# Altium schematic symbol library BARKO_SCHLIB.SchLib: 1064 symbols (part 9 of 11)
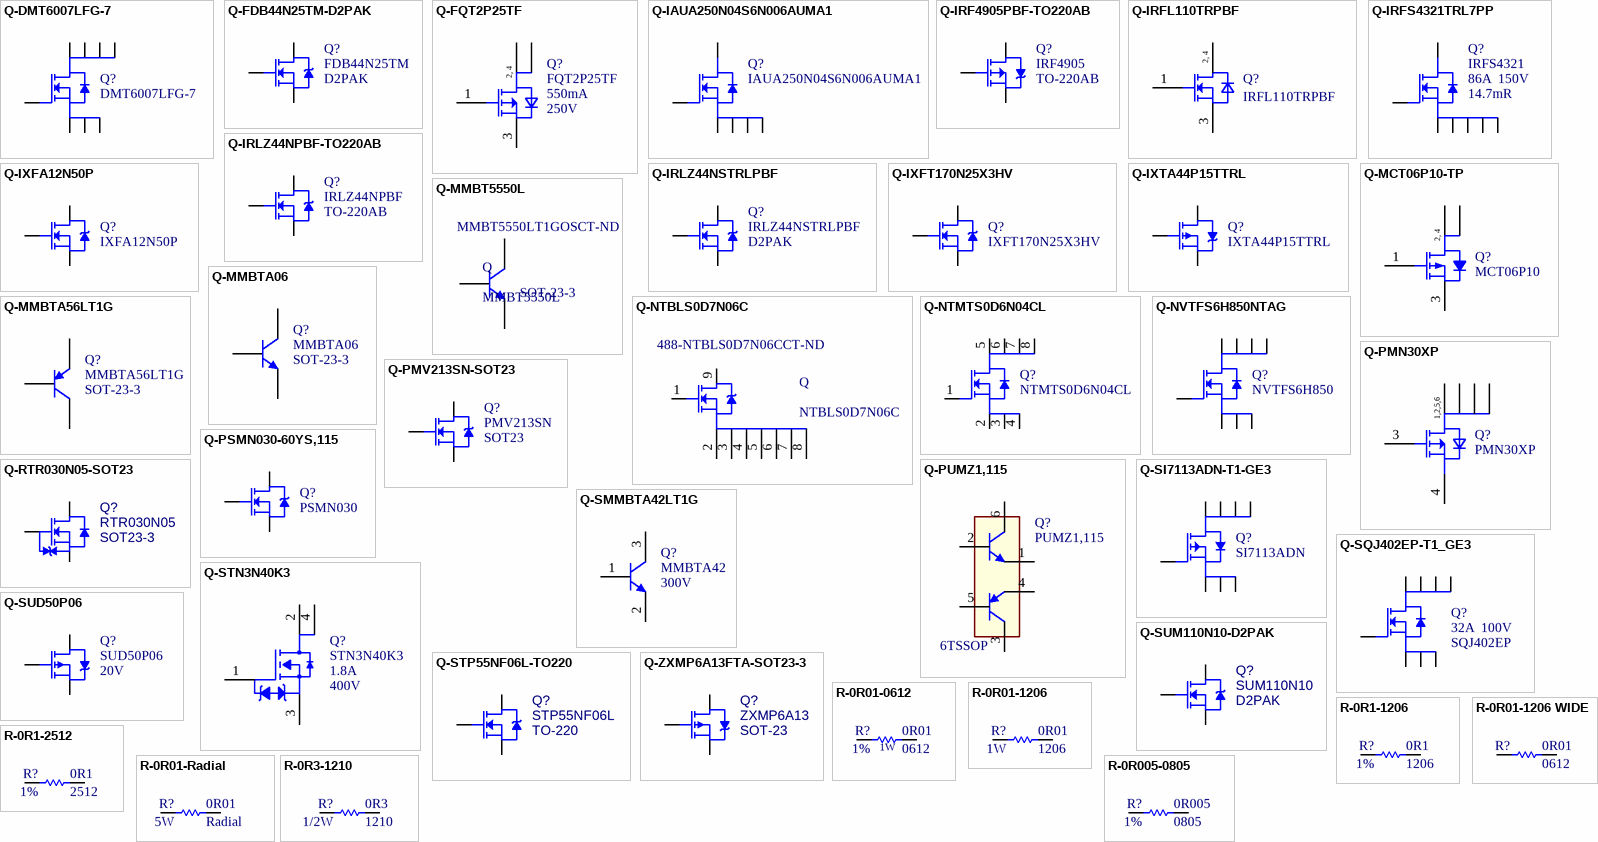
[diagram p49: symbols Q-DMT6007LFG-7 to R-0R005-0805]

## Q-SUM110N10-D2PAK
designator Q?, comment SUM110N10  Case/Package: D2PAK
MOSFET N-CH 100V 110A D2PAK; Manufacturer: Vishay Siliconix; Manufacturer Part Number: SUM110N10-09-E3; Nominal Vgs: 4V; Rds On Max: 9.5mR; Input Capacitance: 6.7nF; Rise Time: 125ns; Max Power Dissipation: 3.75W; Gate to Source Voltage (Vgs): 20V; Fall Time: 130ns; Turn-Off Delay Time: 55ns; Turn-On Delay Time: 20ns; Number of Elements: 1; Reverse Recovery Time: 70ns; Element Configuration: Single; .PCBCHK: USED; .Creator: F:TALI; Washability: OK; Supplier 1: Digi-Key; Supplier Part Number 1: SUM110N10-09-E3DKR-ND; Stock 1: 11942; Pricing 1: 1=3.67, 10=3.279, 100=2.6892 (USD); Mount: Surface Mount; Number of Pins: 3; Weight: 0.050717oz; Min Operating Temperature: -55°C; Max Operating Temperature: 175°C; Package Quantity: 800; Packaging: Tape and Reel; Dual Supply Voltage: 100V; Drain to Source Voltage (Vdss): 100V; Continuous Drain Current (ID): 110A; Drain to Source Breakdown Voltage: 100V; Drain to Source Resistance: 9.5mR; Threshold Voltage: 4V; Power Dissipation: 3.75W; Termination: SMD/SMT; Number of Channels: 1; On-State Resistance: 9.5MR; Length: 10.41mm; Height: 4.83mm; Width: 9.65mm; Radiation Hardening: No; REACH SVHC: Unknown; Lead Free: Lead Free; ComponentLink1URL: http://www.vishay.com/docs/70677/sum110n1.pdf; ComponentLink1Description: http://www.vishay.com/docs/70677/sum110n1.pdf; ComponentLink2URL: http://www.farnell.com/datasheets/492045.pdf; ComponentLink2Description: http://www.farnell.com/datasheets/492045.pdf; .SCHCHK: USED
footprint D2PAK-TO-263
pins: 1 G, 2 S, 3 D

## Q-ZXMP6A13FTA-SOT23-3
designator Q?, comment ZXMP6A13  Case/Package: SOT-23
MOSFET P-CH 60V 0.9A SOT23-3; Manufacturer: Diodes Zetex; Manufacturer Part Number: ZXMP6A13FTA; Input Capacitance: 219pF; Number of Elements: 1; Max Power Dissipation: 625mW; Rise Time: 2.2ns; Rds On Max: 400mR; Drain to Source Resistance: 600mR; Gate to Source Voltage (Vgs): 20V; Fall Time: 5.7ns; Turn-Off Delay Time: 11.2ns; Turn-On Delay Time: 1.6ns; Drain to Source Voltage (Vdss): -60V; Continuous Drain Current (ID): 1.1A; Threshold Voltage: -3V; Power Dissipation: 806mW; Element Configuration: Single; Current Rating: -1.1A; .PCBCHK: USED; .Creator: F:TALI; Washability: OK; Supplier 1: Digi-Key; Supplier Part Number 1: ZXMP6A13FDKR-ND; Stock 1: 261434; Pricing 1: 1=0.65, 10=0.544, 100=0.4079, 500=0.29912, 1000=0.23113 (USD); Mount: Surface Mount; Number of Pins: 3; Weight: 0.000282oz; Contact Plating: Matte,Tin; Min Operating Temperature: -55°C; Max Operating Temperature: 150°C; Packaging: Tape and Reel; Package Quantity: 3000; Number of Channels: 1; On-State Resistance: 600mR; Voltage Rating (DC): -60V; Length: 3.04mm; Height: 1.02mm; Width: 1.4mm; Radiation Hardening: No; REACH SVHC: No SVHC; Lead Free: Lead Free; ComponentLink1URL: http://www.farnell.com/datasheets/1915640.pdf; ComponentLink1Description: http://www.farnell.com/datasheets/1915640.pdf; ComponentLink2URL: http://docs-europe.electrocomponents.com/webdocs/0d2e/0900766b80d2efb2.pdf; ComponentLink2Description: http://docs-europe.electrocomponents.com/webdocs/0d2e/0900766b80d2efb2.pdf; ComponentLink3URL: http://www.diodes.com/datasheets/ZXMP6A13F.pdf; ComponentLink3Description: http://www.diodes.com/datasheets/ZXMP6A13F.pdf; ComponentLink4URL: http://www.mouser.com/ds/2/115/ZXMP6A13F-77652.pdf; ComponentLink4Description: http://www.mouser.com/ds/2/115/ZXMP6A13F-77652.pdf; .SCHCHK: USED; Supplier 2: Digi-Key; Supplier Part Number 2: SUD50P06-15-GE3DKR-ND; Stock 2: 17302; Pricing 2: 1=2.57, 10=2.319, 100=1.8637, 500=1.44958, 1000=1.20108 (USD); Drain to Source Breakdown Voltage: -60V; ComponentLink5URL: http://www.vishay.com/docs/68940/sud50p06.pdf?src-supplier=Digi-Key; ComponentLink5Description: http://www.vishay.com/docs/68940/sud50p06.pdf?src-supplier=Digi-Key; ComponentLink6URL: http://www.farnell.com/datasheets/2049645.pdf?src-supplier=Element14; ComponentLink6Description: http://www.farnell.com/datasheets/2049645.pdf?src-supplier=Element14; ComponentLink7URL: http://www.mouser.com/ds/2/427/sud50p06-244530.pdf?src-supplier=Mouser; ComponentLink7Description: http://www.mouser.com/ds/2/427/sud50p06-244530.pdf?src-supplier=Mouser; ComponentLink8URL: http://www.vishay.com/docs/68940/sud50p06.pdf?src-supplier=Farnell; ComponentLink8Description: http://www.vishay.com/docs/68940/sud50p06.pdf?src-supplier=Farnell; ComponentLink9URL: http://www.vishay.com/docs/68940/sud50p06.pdf?src-supplier=Avnet; ComponentLink9Description: http://www.vishay.com/docs/68940/sud50p06.pdf?src-supplier=Avnet; ComponentLink10URL: http://www.vishay.com/docs/68940/sud50p06.pdf?src-supplier=Avnet+Europe; ComponentLink10Description: http://www.vishay.com/docs/68940/sud50p06.pdf?src-supplier=Avnet+Europe; ComponentLink11URL: http://www.vishay.com/docs/68940/sud50p06.pdf?src-supplier=Future+Electronics; ComponentLink11Description: http://www.vishay.com/docs/68940/sud50p06.pdf?src-supplier=Future+Electronics; ComponentLink12URL: http://datasheet.iiic.cc/vishay_[siliconix]/SUD50P06-15-GE3.pdf?src-supplier=IIIC; ComponentLink12Description: http://datasheet.iiic.cc/vishay_[siliconix]/SUD50P06-15-GE3.pdf?src-supplier=IIIC; RoHS: No
footprint SOT23-3
pins: 1 G, 2 S, 3 D

## R-0R01-0612
designator R?, comment 0R01  Tolerance: 1%  Power Rating: 1W  Case Code (Imperial): 0612
RES 0.01 OHM 1W 1206 WIDE; Manufacturer: Panasonic; Manufacturer Part Number: ERJ-B2CFR01V; Resistance: 10mR; Temperature Coefficient: 300ppm/°C; Voltage Rating: 200V; Washability: OK; .Creator: M.OZKAN; .PCBCHK: USED; Supplier 1: Digi-Key; Stock 1: 0; Pricing 1: 5000=0.08296 (USD); RoHS: Yes; Mount: Surface Mount; Case/Package: 1206; Contact Plating: Tin; Case Code (Metric): 1632; Min Operating Temperature: -55°C; Max Operating Temperature: 155°C; Composition: Thick Film; Packaging: Tape and Reel; Package Quantity: 5000; Number of Terminations: 2; Termination: SMD/SMT; Military Standard: Not; Max Power Dissipation: 1W; Voltage Rating (DC): 200V; Length: 1.6mm; Height: 0.031inch; Width: 0.126inch; Depth: 3.2mm; Radiation Hardening: No; REACH SVHC: Unknown; Lead Free: Lead Free; ComponentLink1URL: https://datasheet.ciiva.com/17212/aoa0000ce23-17212038.pdf?src-supplier=Avnet+Europe; ComponentLink1Description: https://datasheet.ciiva.com/17212/aoa0000ce23-17212038.pdf?src-supplier=Avnet+Europe; ComponentLink2URL: https://datasheet.ciiva.com/46437/1497268-46437047.pdf?src-supplier=Element14; ComponentLink2Description: https://datasheet.ciiva.com/46437/1497268-46437047.pdf?src-supplier=Element14; ComponentLink3URL: https://datasheet.ciiva.com/24065/aoa0000ce23-72160-24065449.pdf?src-supplier=Mouser; ComponentLink3Description: https://datasheet.ciiva.com/24065/aoa0000ce23-72160-24065449.pdf?src-supplier=Mouser; ComponentLink4URL: https://datasheet.ciiva.com/9194/aoa0000ce23-9194127.pdf?src-supplier=Avnet; ComponentLink4Description: https://datasheet.ciiva.com/9194/aoa0000ce23-9194127.pdf?src-supplier=Avnet; Supplier Part Number 1: ERJ-B2CFR01V-ND; .SCHCHK: USED
footprint R-0612 (Chip Resistor, 2-Leads, Body 1,60x3,20mm, IPC Medium Density)
pins: 1, 2

## R-0R01-1206
designator R?, comment 0R01  Power Rating: 1W  Case/Package: 1206
RES 0.01 OHM 1% 1W 1206; Manufacturer: Panasonic; Manufacturer Part Number: ERJ8CWFR010V; Resistance: 10mR; Temperature Coefficient: 75ppm/°C; Washability: OK; .Creator: M.OZKAN; .PCBCHK: USED; Supplier 1: Digi-Key; Stock 1: 255816; Pricing 1: 1=0.71000, 10=0.54500, 100=0.22910, 1000=0.12638, 2500=0.11848 (USD); RoHS: Yes; Mount: Surface Mount; Case Code (Metric): 3216; Case Code (Imperial): 1206; Min Operating Temperature: -55°C; Max Operating Temperature: 125°C; Packaging: Cut Tape; Tolerance: 1%; Composition: Thick Film; Number of Terminations: 2; Military Standard: Not; Termination: Flat; Max Power Dissipation: 1W; Features: Automotive AEC-Q200; Length: 3.2mm; Height: 0.03inch; Width: 0.063inch; Depth: 1.6mm; REACH SVHC: No SVHC; Lead Free: Lead Free; ComponentLink1URL: https://datasheet.ciiva.com/25608/0900766b81107548-25608655.pdf?src-supplier=RSComponents; ComponentLink1Description: https://datasheet.ciiva.com/25608/0900766b81107548-25608655.pdf?src-supplier=RSComponents; ComponentLink2URL: https://datasheet.ciiva.com/48532/erj8cw-eng-tds-48532780.pdf?src-supplier=Distrelec; ComponentLink2Description: https://datasheet.ciiva.com/48532/erj8cw-eng-tds-48532780.pdf?src-supplier=Distrelec; ComponentLink3URL: https://datasheet.ciiva.com/7937/1790602-7937371.pdf?src-supplier=Element14; ComponentLink3Description: https://datasheet.ciiva.com/7937/1790602-7937371.pdf?src-supplier=Element14; Supplier Part Number 1: P0.01BVCT-ND; .SCHCHK: USED
footprint R-1206
pins: 1, 2

## R-0R1-1206
designator R?, comment 0R1  Tolerance: 1%  Case/Package: 1206
RES 0.1 OHM 1% 1/2W 1206; Manufacturer: Stackpole Electronics; Manufacturer Part Number: CSR1206FTR100; Resistance: 100mR; Max Power Dissipation: 500mW; Temperature Coefficient: 100ppm/°C; Washability: OK; .Creator: M.OZKAN; .PCBCHK: USED; Supplier 1: Digi-Key; Stock 1: 200668; Pricing 1: 1=0.42000, 10=0.31900, 25=0.24240, 50=0.18020, 100=0.13400, 250=0.11320, 500=0.09702, 1000=0.07392 (USD); RoHS: Yes; Mount: Surface Mount; Case Code (Metric): 3216; Case Code (Imperial): 1206; Contact Plating: Tin,Matte; Min Operating Temperature: -55°C; Max Operating Temperature: 155°C; Packaging: Tape and Reel; Package Quantity: 1; Composition: Thick Film; Number of Terminations: 2; Military Standard: Not; Length: 0.12inch; Height: 0.026inch; Width: 0.061inch; Depth: 1.55mm; Radiation Hardening: No; Lead Free: Lead Free; ComponentLink1URL: https://datasheet.ciiva.com/26835/getdatasheetpartid-743581-26835493.pdf?src-supplier=Verical; ComponentLink1Description: https://datasheet.ciiva.com/26835/getdatasheetpartid-743581-26835493.pdf?src-supplier=Verical; Supplier Part Number 1: CSR1206FTR100CT-ND; .SCHCHK: USED
footprint R-1206
pins: 1, 2

## R-0R01-1206 WIDE
designator R?, comment 0R01  Case/Package: 0612
RES SMD 0.01 OHM 1.5W 1206 WIDE; Manufacturer: Stackpole Electronics; Manufacturer Part Number: CSRF0612FT10L0; Resistance: 10mR; Tolerance: 1%; Temperature Coefficient: 75ppm/°C; .PCBCHK: USED; .Creator: F:TALI; Power Rating: 100mW; Voltage Rating: 50V; Washability: OK; Supplier 1: Digi-Key; Supplier Part Number 1: CSRF0612FT10L0DKR-ND; Stock 1: 11641; Pricing 1: 1=0.63, 10=0.526, 25=0.4504, 50=0.4054, 100=0.3529, 250=0.31532, 500=0.25526, 1000=0.20646 (USD); Case Code (Metric): 3216; Min Operating Temperature: -55°C; Max Operating Temperature: 170°C; Packaging: Tape and Reel; Composition: Metal Foil; Number of Terminations: 2; Max Power Dissipation: 1.5W; Features: Moisture Resistant; Length: 0.063inch; Height: 0.032inch; Width: 0.126inch; .SCHCHK: USED; RoHS: Yes; Mount: Surface Mount; Contact Plating: Tin,Matte; Package Quantity: 1; Radiation Hardening: No; Lead Free: Lead Free; ComponentLink1URL: http://components.arrow.com/part/dataview/53689089S356097N1174?src-supplier=Arrow; ComponentLink1Description: http://components.arrow.com/part/dataview/53689089S356097N1174?src-supplier=Arrow; ComponentLink2URL: https://www.seielect.com/Catalog/SEI-CSR_CSRN.pdf?src-supplier=Digi-Key; ComponentLink2Description: https://www.seielect.com/Catalog/SEI-CSR_CSRN.pdf?src-supplier=Digi-Key; ComponentLink3URL: https://www.seielect.com/Catalog/SEI-CSR_CSRN.pdf?src-supplier=Avnet; ComponentLink3Description: https://www.seielect.com/Catalog/SEI-CSR_CSRN.pdf?src-supplier=Avnet; Number of Pins: 2; Termination: SMD/SMT; Military Standard: Not; Voltage Rating (DC): 50V; Depth: 0.5mm; REACH SVHC: No SVHC; ComponentLink4URL: https://datasheet.ciiva.com/11821/0900766b80f80784-11821292.pdf?src-supplier=RSComponents; ComponentLink4Description: https://datasheet.ciiva.com/11821/0900766b80f80784-11821292.pdf?src-supplier=RSComponents; ComponentLink5URL: https://datasheet.ciiva.com/43467/1678782-43467173.pdf?src-supplier=Farnell; ComponentLink5Description: https://datasheet.ciiva.com/43467/1678782-43467173.pdf?src-supplier=Farnell; ComponentLink6URL: https://datasheet.ciiva.com/5917/aoa0000ce2-5917817.pdf?src-supplier=Farnell; ComponentLink6Description: https://datasheet.ciiva.com/5917/aoa0000ce2-5917817.pdf?src-supplier=Farnell; ComponentLink7URL: https://datasheet.ciiva.com/16777/70260748-16777705.pdf?src-supplier=Allied+Electronics; ComponentLink7Description: https://datasheet.ciiva.com/16777/70260748-16777705.pdf?src-supplier=Allied+Electronics; ComponentLink8URL: https://datasheet.ciiva.com/46373/1678782-46373081.pdf?src-supplier=Element14; ComponentLink8Description: https://datasheet.ciiva.com/46373/1678782-46373081.pdf?src-supplier=Element14; ComponentLink9URL: https://datasheet.ciiva.com/7836/aoa0000ce2-7836490.pdf?src-supplier=Element14; ComponentLink9Description: https://datasheet.ciiva.com/7836/aoa0000ce2-7836490.pdf?src-supplier=Element14; ComponentLink10URL: https://datasheet.ciiva.com/46373/1678782-46373082.pdf?src-supplier=Element14; ComponentLink10Description: https://datasheet.ciiva.com/46373/1678782-46373082.pdf?src-supplier=Element14; ComponentLink11URL: https://datasheet.ciiva.com/9190/aoa0000ce2-9190507.pdf?src-supplier=Avnet; ComponentLink11Description: https://datasheet.ciiva.com/9190/aoa0000ce2-9190507.pdf?src-supplier=Avnet; ComponentLink12URL: https://datasheet.ciiva.com/17210/aoa0000ce2-17210220.pdf?src-supplier=Avnet+Europe; ComponentLink12Description: https://datasheet.ciiva.com/17210/aoa0000ce2-17210220.pdf?src-supplier=Avnet+Europe; ComponentLink13URL: https://datasheet.ciiva.com/7836/426256-7836813.pdf?src-supplier=Element14; ComponentLink13Description: https://datasheet.ciiva.com/7836/426256-7836813.pdf?src-supplier=Element14; ComponentLink14URL: https://datasheet.ciiva.com/16514/aoa0000ce2-16514334.pdf?src-supplier=Avnet+Asia; ComponentLink14Description: https://datasheet.ciiva.com/16514/aoa0000ce2-16514334.pdf?src-supplier=Avnet+Asia; ComponentLink15URL: https://datasheet.ciiva.com/24023/aoa0000ce2-24023999.pdf?src-supplier=Mouser; ComponentLink15Description: https://datasheet.ciiva.com/24023/aoa0000ce2-24023999.pdf?src-supplier=Mouser; Case Code (Imperial): 1206; Stock: 2796; Pricing: 1=0.1, 10=0.034, 100=0.014, 1000=0.0063, 2500=0.0055 (USD); ComponentLink16URL: https://www.seielect.com/Catalog/SEI-RMCF_RMCP.pdf?src-supplier=Digi-Key; ComponentLink16Description: https://www.seielect.com/Catalog/SEI-RMCF_RMCP.pdf?src-supplier=Digi-Key; ComponentLink17URL: https://www.seielect.com/catalog/SEI-RMCF_RMCP.pdf?src-supplier=Avnet; ComponentLink17Description: https://www.seielect.com/catalog/SEI-RMCF_RMCP.pdf?src-supplier=Avnet
footprint r-0612 (Chip Resistor, 2-Leads, Body 1,60x3,20mm, IPC Medium Density)
pins: 1, 2

## R-0R1-2512
designator R?, comment 0R1  Case Code (Imperial): 2512  Tolerance: 1%
RES 0.1 OHM 1% 3W 2512; Manufacturer: Bourns; Manufacturer Part Number: CRA2512FZR100ELF; Temperature Coefficient: 75ppm/°C; Resistance: 100mR; Washability: OK; .Creator: M.OZKAN; .PCBCHK: USED; Supplier 1: Digi-Key; Stock 1: 0; RoHS: Yes; Mount: Surface Mount; Case/Package: 2512; Number of Pins: 2; Contact Plating: Tin; Case Code (Metric): 6432; Min Operating Temperature: -55°C; Max Operating Temperature: 170°C; Power Rating: 3W; Packaging: Tape and Reel; Package Quantity: 1; Features: Moisture Resistant; Max Power Dissipation: 3W; Termination: SMD/SMT; Composition: Metal Film,Thick Film; Number of Terminations: 2; Military Standard: Not; Length: 6.4mm; Height: 0.6mm; Width: 3.2mm; Depth: 3.35mm; Radiation Hardening: No; REACH SVHC: No SVHC; ComponentLink1URL: https://datasheet.ciiva.com/2605/cra-2605648.pdf?src-supplier=Avnet; ComponentLink1Description: https://datasheet.ciiva.com/2605/cra-2605648.pdf?src-supplier=Avnet; ComponentLink2URL: https://datasheet.ciiva.com/11811/0900766b80ddce06-11811574.pdf?src-supplier=RSComponents; ComponentLink2Description: https://datasheet.ciiva.com/11811/0900766b80ddce06-11811574.pdf?src-supplier=RSComponents; ComponentLink3URL: https://datasheet.ciiva.com/22692/1849485-22692565.pdf?src-supplier=Element14; ComponentLink3Description: https://datasheet.ciiva.com/22692/1849485-22692565.pdf?src-supplier=Element14; ComponentLink4URL: https://datasheet.ciiva.com/2481/cra-2481807.pdf?src-supplier=Digi-Key; ComponentLink4Description: https://datasheet.ciiva.com/2481/cra-2481807.pdf?src-supplier=Digi-Key; ComponentLink5URL: https://datasheet.ciiva.com/30251/937cra-30251526.pdf?src-supplier=Onlinecomponents.com; ComponentLink5Description: https://datasheet.ciiva.com/30251/937cra-30251526.pdf?src-supplier=Onlinecomponents.com; ComponentLink6URL: https://datasheet.ciiva.com/2481/cra-2481805.pdf?src-supplier=Digi-Key; ComponentLink6Description: https://datasheet.ciiva.com/2481/cra-2481805.pdf?src-supplier=Digi-Key; ComponentLink7URL: https://datasheet.ciiva.com/2481/cra-2481806.pdf?src-supplier=Digi-Key; ComponentLink7Description: https://datasheet.ciiva.com/2481/cra-2481806.pdf?src-supplier=Digi-Key; ComponentLink8URL: https://datasheet.ciiva.com/1480/1849485-1480655.pdf?src-supplier=Element14; ComponentLink8Description: https://datasheet.ciiva.com/1480/1849485-1480655.pdf?src-supplier=Element14; Supplier Part Number 1: CRA2512-FZ-R100ELFTR-ND; .SCHCHK: USED
footprint R-2512
pins: 1, 2

## R-0R01-Radial
designator R?, comment 0R01  Power Rating: 5W  Case/Package: Radial
RES TH .01 OHM 5W 5% RADIAL; Manufacturer: Stackpole Electronics; Manufacturer Part Number: MPR5JB10L0; Resistance: 10mR; Temperature Coefficient: 350ppm/°C; .PCBCHK: USED; .Creator: F:TALI; Washability: OK; Supplier 1: Digi-Key; Supplier Part Number 1: MPR5JB10L0-ND; Stock 1: 5526; Pricing 1: 1=0.76, 10=0.66, 25=0.58, 50=0.53, 100=0.46, 250=0.4, 500=0.332, 1000=0.27, 5000=0.2576 (USD); Mount: Through Hole; Contact Plating: Matte,Tin; Min Operating Temperature: -55°C; Max Operating Temperature: 275°C; Packaging: Bulk; Tolerance: 5%; Package Quantity: 1000; Composition: Metal Film; Number of Terminations: 2; Max Power Dissipation: 5W; Length: 0.551inch; Height: 0.748inch; Width: 0.197inch; Radiation Hardening: No; .SCHCHK: USED
footprint R-0R01-CURRENT SENSE
pins: 1, 2

## R-0R3-1210
designator R?, comment 0R3  Max Power Dissipation: 1/2W  Case Code (Imperial): 1210
RES SMD 0.3 OHM 1% 1/2W 1210; Manufacturer: Panasonic; Manufacturer Part Number: ERJ-14BQFR30U; Resistance: 300mR; Power Rating: 500mW; Temperature Coefficient: 200ppm/°C; .PCBCHK: USED; .Creator: F:TALI; Washability: OK; Stock 1: 0; Pricing 1: 1=0.65, 10=0.497, 100=0.2091, 1000=0.11535, 2500=0.10814 (USD); Mount: Surface Mount; Case/Package: 1210; Case Code (Metric): 3225; Min Operating Temperature: -55°C; Max Operating Temperature: 125°C; Tolerance: 1%; Package Quantity: 5000; Packaging: Tape and Reel; Composition: Thick Film; Number of Terminations: 2; Termination: SMD/SMT; Military Standard: Not; Features: Automotive AEC-Q200; Length: 3.2mm; Height: 0.6mm; Width: 2.5mm; Depth: 2.5mm; ComponentLink1URL: http://www.mouser.com/ds/2/315/AOA0000CE3-72189.pdf; ComponentLink1Description: http://www.mouser.com/ds/2/315/AOA0000CE3-72189.pdf; ComponentLink2URL: http://uk.rs-online.com/webdocs/13b8/0900766b813b869e.pdf; ComponentLink2Description: http://uk.rs-online.com/webdocs/13b8/0900766b813b869e.pdf; Stock 2: 0; Contact Plating: Tin; Radiation Hardening: No; Lead Free: Lead Free; REACH SVHC: No SVHC; ComponentLink3URL: http://www.vishay.com/docs/20019/rcwe.pdf; ComponentLink3Description: http://www.vishay.com/docs/20019/rcwe.pdf; ComponentLink4URL: http://www.farnell.com/datasheets/622222.pdf; ComponentLink4Description: http://www.farnell.com/datasheets/622222.pdf; ComponentLink5URL: http://www.farnell.com/datasheets/2050301.pdf; ComponentLink5Description: http://www.farnell.com/datasheets/2050301.pdf; Stock 3: 39060; Pricing 3: 1=0.61, 10=0.505, 25=0.4332, 50=0.3898, 100=0.3393, 250=0.3032, 500=0.24544, 1000=0.19852 (USD); .SCHCHK: USED; Supplier 1: Digi-Key; Supplier Part Number 1: P17277DKR-ND
footprint R-1210
pins: 1, 2

## R-0R005-0805
designator R?, comment 0R005  Tolerance: 1%  Case/Package: 0805
RES 0.005 OHM 1% 1/2W 0805; Manufacturer: Bourns; Manufacturer Part Number: CRF0805-FZ-R005ELF; Resistance: 5mR; Power Rating: 500mW; Temperature Coefficient: 75ppm/°C; Washability: OK; .Creator: M.OZKAN; .PCBCHK: USED; Supplier 1: Digi-Key; Supplier Part Number 1: CRF0805-FZ-R005ELFCT-ND; Stock 1: 10585; Pricing 1: 1=0.54000, 10=0.41700, 100=0.17550, 1000=0.09680, 2500=0.09075 (USD); RoHS: Yes; Weight: 0.000194oz; Case Code (Imperial): 0805; Case Code (Metric): 2012; Min Operating Temperature: -55°C; Max Operating Temperature: 170°C; Packaging: Tape and Reel; Package Quantity: 5000; Features: Moisture Resistant,Automotive AEC-Q200; Max Power Dissipation: 500mW; Composition: Metal Film; Number of Terminations: 2; Termination: SMD/SMT; Length: 0.079inch; Height: 0.6mm; Width: 0.049inch; Height - Seated (Max): 0.031inch; ComponentLink1URL: http://www.farnell.com/datasheets/2194442.pdf?src-supplier=Farnell; ComponentLink1Description: http://www.farnell.com/datasheets/2194442.pdf?src-supplier=Farnell; ComponentLink2URL: http://www.mouser.com/ds/2/54/rf-937137.pdf?src-supplier=Mouser; ComponentLink2Description: http://www.mouser.com/ds/2/54/rf-937137.pdf?src-supplier=Mouser; ComponentLink3URL: https://www.bourns.com/docs/Product-Datasheets/CRF.pdf?src-supplier=Digi-Key; ComponentLink3Description: https://www.bourns.com/docs/Product-Datasheets/CRF.pdf?src-supplier=Digi-Key; ComponentLink4URL: http://www.farnell.com/datasheets/2194442.pdf?src-supplier=Newark; ComponentLink4Description: http://www.farnell.com/datasheets/2194442.pdf?src-supplier=Newark; .SCHCHK: USED
footprint R-0805
pins: 1, 2

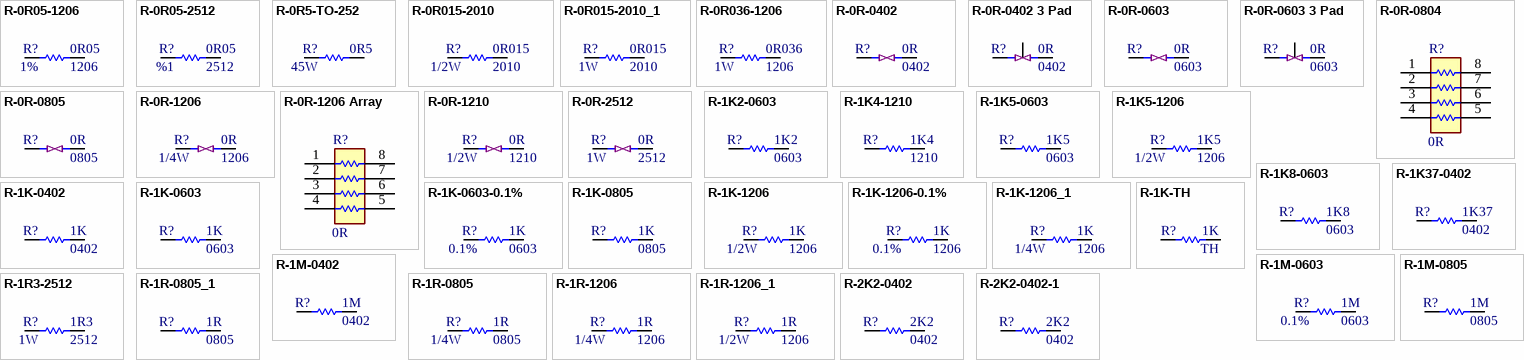
[diagram p35: symbols R-0R05-1206 to R-2K2-0402-1]

## R-0R05-1206
designator R?, comment 0R05  Tolerance: 1%  Case/Package: 1206
RES 0.05 OHM 1% 1/2W 1206; Manufacturer: Stackpole Electronics; Manufacturer Part Number: CSR1206FT50L0; Resistance: 50mR; Max Power Dissipation: 500mW; Temperature Coefficient: 100ppm/°C; Washability: OK; .Creator: M.OZKAN; .PCBCHK: USED; Supplier 1: Digi-Key; Stock 1: 233951; Pricing 1: 1=0.52000, 10=0.39800, 25=0.30320, 50=0.22520, 100=0.16750, 250=0.14148, 500=0.12128, 1000=0.09240 (USD); RoHS: Yes; Mount: Surface Mount; Case Code (Metric): 3216; Case Code (Imperial): 1206; Contact Plating: Tin,Matte; Min Operating Temperature: -55°C; Max Operating Temperature: 155°C; Packaging: Tape and Reel; Package Quantity: 1; Composition: Thick Film; Number of Terminations: 2; Length: 0.12inch; Height: 0.026inch; Width: 0.061inch; Radiation Hardening: No; Lead Free: Lead Free; ComponentLink1URL: http://components.arrow.com/part/dataview/53689089S356097N1174?src-supplier=Arrow; ComponentLink1Description: http://components.arrow.com/part/dataview/53689089S356097N1174?src-supplier=Arrow; ComponentLink2URL: https://www.seielect.com/Catalog/SEI-CSR_CSRN.pdf?src-supplier=Digi-Key; ComponentLink2Description: https://www.seielect.com/Catalog/SEI-CSR_CSRN.pdf?src-supplier=Digi-Key; ComponentLink3URL: https://www.seielect.com/Catalog/SEI-CSR_CSRN.pdf?src-supplier=Avnet; ComponentLink3Description: https://www.seielect.com/Catalog/SEI-CSR_CSRN.pdf?src-supplier=Avnet; Supplier Part Number 1: CSR1206FT50L0CT-ND; .SCHCHK: USED
footprint R-1206
pins: 1, 2

## R-0R05-2512
designator R?, comment 0R05  Case/Package: 2512  Tolerance: %1
RES 0.05 OHM 1% 3W 2512; Manufacturer: ROYALOHM; Manufacturer Part Number: MS123WF500MT4S; Washability: OK; .Creator: M.OZKAN; .PCBCHK: USED; Supplier 1: Digi-Key; Supplier Part Number 1: 696-1841-1-ND; Stock 1: 6455; Pricing 1: 1=0.63000, 10=0.45100, 25=0.35160, 50=0.29760, 100=0.23450, 250=0.19844, 500=0.16236, 1000=0.12628 (USD); RoHS: No; .SCHCHK: USED
footprint R-2512
pins: 1, 2

## R-0R5-TO-252
designator R?, comment 0R5  Max Power Dissipation: 45W
RES 0.5 OHM 5% 45W PFC10; Manufacturer: Ohmite; Manufacturer Part Number: TKH45PR500JE-TR; Resistance: 500mR; Temperature Coefficient: 100ppm/°C; Supplier 1: Digi-Key; Supplier Part Number 1: TKH45PR500JECT-ND; Stock: 810; Pricing: 1=2.29, 10=2.035, 100=1.554 (USD); RoHS: No; Case/Package: SMD/SMT; Min Operating Temperature: -55°C; Max Operating Temperature: 175°C; Resistor Type: Thick Film; Packaging: Cut Tape; Tolerance: 5%; Number of Terminations: 2; ComponentLink1URL: http://www.ohmite.com/assets/docs/res_tkh.pdf?r=false&src-supplier=Digi-Key; ComponentLink1Description: http://www.ohmite.com/assets/docs/res_tkh.pdf?r=false&src-supplier=Digi-Key
footprint R-TO-252
pins: 1, 2

## R-0R015-2010
designator R?, comment 0R015  Max Power Dissipation: 1/2W  Case Code (Imperial): 2010
RES SMD 0.015 OHM 1% 1/2W 2010; Manufacturer: Vishay Dale; Manufacturer Part Number: WSL2010R0150FEA; Resistance: 15mR; Temperature Coefficient: 75ppm/°C; Power Rating: 500mW; Voltage Rating: 70mV; .PCBCHK: USED; .Creator: F:TALI; Washability: OK; Supplier 1: Digi-Key; Supplier Part Number 1: WSLE-.015CT-ND; Stock 1: 90901; Pricing 1: 1=1.01, 10=0.895, 25=0.8228, 50=0.7508, 100=0.6497, 250=0.54864, 500=0.462, 1000=0.38404 (USD); Mount: Surface Mount; Case/Package: 2010; Number of Pins: 2; Weight: 0.001372oz; Contact Plating: Matte,Tin; Case Code (Metric): 5025; Min Operating Temperature: -65°C; Tolerance: 1%; Composition: Metal Element,Metal Film,Metal Strip; Packaging: Tape and Reel; Package Quantity: 1; Termination: SMD/SMT; Voltage Rating (DC): 70mV; Number of Terminations: 2; Military Standard: Not; Features: Moisture Resistant; Length: 5.08mm; Height: 0.635mm; Width: 2.5mm; Depth: 2.54mm; Radiation Hardening: No; REACH SVHC: Unknown; Lead Free: Lead Free; ComponentLink1URL: http://www.farnell.com/datasheets/2049120.pdf; ComponentLink1Description: http://www.farnell.com/datasheets/2049120.pdf; ComponentLink2URL: http://www.vishay.com/docs/30100/wsl.pdf; ComponentLink2Description: http://www.vishay.com/docs/30100/wsl.pdf; ComponentLink3URL: https://www.verical.com/server-webapp/html/getDatasheet?partID=99228; ComponentLink3Description: https://www.verical.com/server-webapp/html/getDatasheet?partID=99228; ComponentLink4URL: http://www.farnell.com/datasheets/1911169.pdf; ComponentLink4Description: http://www.farnell.com/datasheets/1911169.pdf; Supplier 2: Digi-Key; Supplier Part Number 2: P19351DKR-ND; Stock 2: 2269; Pricing 2: 1=0.66, 10=0.553, 25=0.4744, 50=0.427, 100=0.3716, 250=0.33204, 500=0.2688, 1000=0.21741 (USD); ComponentLink5URL: http://www.vishay.com/docs/31057/wslhigh.pdf; ComponentLink5Description: http://www.vishay.com/docs/31057/wslhigh.pdf; Max Operating Temperature: 170°C; .SCHCHK: USED
footprint R-2010
pins: 1, 2

## R-0R015-2010_1
designator R?, comment 0R015  Power Rating: 1W  Case Code (Imperial): 2010
RES SMD 0.015 OHM 1% 1W 2010; Manufacturer: Vishay Dale; Manufacturer Part Number: WSL2010R0150FEA18; Resistance: 15mR; Temperature Coefficient: 75ppm/°C; .PCBCHK: USED; .Creator: F:TALI; Washability: OK; Supplier 1: Digi-Key; Supplier Part Number 1: WSLF-.015DKR-ND; Stock 1: 16297; Pricing 1: 1=1.31, 10=1.164, 25=1.07, 50=0.976, 100=0.8446, 250=0.7132, 500=0.6006, 1000=0.49925 (USD); Mount: Surface Mount; Contact Plating: Matte,Tin; Case Code (Metric): 5025; Min Operating Temperature: -65°C; Max Operating Temperature: 170°C; Tolerance: 1%; Composition: Metal Strip; Packaging: Tape and Reel; Package Quantity: 4000; Termination: SMD/SMT; Length: 5mm; Height: 0.635mm; Width: 2.5mm; Depth: 2.54mm; Radiation Hardening: No; REACH SVHC: Unknown; Lead Free: Lead Free; ComponentLink1URL: http://www.vishay.com/docs/31057/wslhigh.pdf; ComponentLink1Description: http://www.vishay.com/docs/31057/wslhigh.pdf; ComponentLink2URL: http://www.farnell.com/datasheets/2049120.pdf; ComponentLink2Description: http://www.farnell.com/datasheets/2049120.pdf; Case/Package: 2010; .SCHCHK: USED
footprint R-2010
pins: 1, 2

## R-0R036-1206
designator R?, comment 0R036  Power Rating: 1W  Case Code (Imperial): 1206
RES 0.036 OHM 5% 1W 1206; Manufacturer: Panasonic; Manufacturer Part Number: ERJ-8CWJR036V; Resistance: 36mR; Temperature Coefficient: 75ppm/°C; .Creator: F:TALI; .PCBCHK: USED; Washability: OK; Supplier 1: Digi-Key; Stock 1: 9728; Pricing 1: 1=0.61, 10=0.464, 100=0.195, 1000=0.10758, 2500=0.10085 (USD); Mount: Surface Mount; Case/Package: 1206; Case Code (Metric): 3216; Min Operating Temperature: -55°C; Max Operating Temperature: 125°C; Packaging: Tape and Reel; Tolerance: 5%; Composition: Thick Film; Number of Terminations: 2; Max Power Dissipation: 1W; Features: Automotive AEC-Q200; Length: 0.126inch; Height: 0.03inch; Width: 0.063inch; Supplier Part Number 1: P0.036BWDKR-ND; .SCHCHK: USED
footprint R-1206
pins: 1, 2

## R-0R-0402
designator R?, comment 0R  Case Code (Imperial): 0402
RES SMD 0 OHM JUMPER 1/16W 0402; Manufacturer: Royal Electronic Factory; Manufacturer Part Number: 0402WGJ0000TCE; Resistance: 0mR; Max Power Dissipation: 63mW; Power Rating: 62.5mW; Tolerance: 5%; Voltage Rating: 50V; Temperature Coefficient: 200ppm/°C; .PCBCHK: USED; .Creator: F:TALI; Washability: OK; ComponentLink1URL: http://www.vishay.com/docs/20035/dcrcwe3.pdf; ComponentLink1Description: http://www.vishay.com/docs/20035/dcrcwe3.pdf; ComponentLink2URL: http://www.farnell.com/datasheets/2111203.pdf; ComponentLink2Description: http://www.farnell.com/datasheets/2111203.pdf; ComponentLink3URL: http://www.farnell.com/datasheets/2045673.pdf; ComponentLink3Description: http://www.farnell.com/datasheets/2045673.pdf; ComponentLink4URL: https://www.distrelec.biz/Web/Downloads/a_/en/flD-CRCW-e3_data_en.pdf?mime=application%2Fpdf; ComponentLink4Description: https://www.distrelec.biz/Web/Downloads/a_/en/flD-CRCW-e3_data_en.pdf?mime=application%2Fpdf; ComponentLink5URL: http://datasheet.octopart.com/CRCW04020000Z0ED-Vishay-datasheet-14722531.pdf; ComponentLink5Description: http://datasheet.octopart.com/CRCW04020000Z0ED-Vishay-datasheet-14722531.pdf; ComponentLink6URL: http://datasheet.octopart.com/CRCW04020000Z0ED-Vishay-datasheet-83961561.pdf; ComponentLink6Description: http://datasheet.octopart.com/CRCW04020000Z0ED-Vishay-datasheet-83961561.pdf; ComponentLink7URL: http://datasheet.octopart.com/CRCW04020000Z0ED-Vishay-datasheet-16179825.pdf; ComponentLink7Description: http://datasheet.octopart.com/CRCW04020000Z0ED-Vishay-datasheet-16179825.pdf; ComponentLink8URL: http://datasheet.octopart.com/CRCW04020000Z0ED-Vishay-datasheet-62317933.pdf; ComponentLink8Description: http://datasheet.octopart.com/CRCW04020000Z0ED-Vishay-datasheet-62317933.pdf; ComponentLink9URL: http://datasheet.octopart.com/CRCW04020000Z0ED-Vishay-datasheet-5300368.pdf; ComponentLink9Description: http://datasheet.octopart.com/CRCW04020000Z0ED-Vishay-datasheet-5300368.pdf; ComponentLink10URL: http://datasheet.octopart.com/CRCW04020000Z0ED-Vishay-datasheet-5306405.pdf; ComponentLink10Description: http://datasheet.octopart.com/CRCW04020000Z0ED-Vishay-datasheet-5306405.pdf; ComponentLink11URL: http://datasheet.octopart.com/CRCW04020000Z0ED-Vishay-datasheet-11516975.pdf; ComponentLink11Description: http://datasheet.octopart.com/CRCW04020000Z0ED-Vishay-datasheet-11516975.pdf; ComponentLink12URL: http://datasheet.octopart.com/CRCW04020000Z0ED-Vishay-datasheet-17599201.pdf; ComponentLink12Description: http://datasheet.octopart.com/CRCW04020000Z0ED-Vishay-datasheet-17599201.pdf; ComponentLink13URL: http://datasheet.octopart.com/CRCW04020000Z0ED-Vishay-datasheet-41302739.pdf; ComponentLink13Description: http://datasheet.octopart.com/CRCW04020000Z0ED-Vishay-datasheet-41302739.pdf; ComponentLink14URL: http://datasheet.octopart.com/CRCW04020000Z0ED-Vishay-datasheet-27121962.pdf; ComponentLink14Description: http://datasheet.octopart.com/CRCW04020000Z0ED-Vishay-datasheet-27121962.pdf; ComponentLink15URL: http://datasheet.octopart.com/CRCW04020000Z0ED-Vishay-datasheet-66077789.pdf; ComponentLink15Description: http://datasheet.octopart.com/CRCW04020000Z0ED-Vishay-datasheet-66077789.pdf; ComponentLink16URL: http://datasheet.octopart.com/CRCW04020000Z0ED-Vishay-datasheet-42367.pdf; ComponentLink16Description: http://datasheet.octopart.com/CRCW04020000Z0ED-Vishay-datasheet-42367.pdf; ComponentLink17URL: http://datasheet.octopart.com/CRCW04020000Z0ED-Vishay-datasheet-148188.pdf; ComponentLink17Description: http://datasheet.octopart.com/CRCW04020000Z0ED-Vishay-datasheet-148188.pdf; ComponentLink18URL: http://datasheet.octopart.com/CRCW04020000Z0ED-Vishay-datasheet-5377255.pdf; ComponentLink18Description: http://datasheet.octopart.com/CRCW04020000Z0ED-Vishay-datasheet-5377255.pdf; ComponentLink19URL: http://datasheet.octopart.com/CRCW04020000Z0ED-Vishay-datasheet-8619608.pdf; ComponentLink19Description: http://datasheet.octopart.com/CRCW04020000Z0ED-Vishay-datasheet-8619608.pdf; ComponentLink20URL: http://datasheet.octopart.com/CRCW04020000Z0ED-Vishay-datasheet-11540273.pdf; ComponentLink20Description: http://datasheet.octopart.com/CRCW04020000Z0ED-Vishay-datasheet-11540273.pdf; ComponentLink21URL: http://datasheet.octopart.com/CRCW04020000Z0ED-Vishay-datasheet-12001583.pdf; ComponentLink21Description: http://datasheet.octopart.com/CRCW04020000Z0ED-Vishay-datasheet-12001583.pdf; ComponentLink22URL: http://datasheet.octopart.com/CRCW04020000Z0ED-Vishay-datasheet-546287.pdf; ComponentLink22Description: http://datasheet.octopart.com/CRCW04020000Z0ED-Vishay-datasheet-546287.pdf; ComponentLink23URL: http://datasheet.octopart.com/CRCW04020000Z0ED-Vishay-datasheet-8361388.pdf; ComponentLink23Description: http://datasheet.octopart.com/CRCW04020000Z0ED-Vishay-datasheet-8361388.pdf; ComponentLink24URL: http://datasheet.octopart.com/CRCW04020000Z0ED-Vishay-datasheet-8788789.pdf; ComponentLink24Description: http://datasheet.octopart.com/CRCW04020000Z0ED-Vishay-datasheet-8788789.pdf; ComponentLink25URL: http://datasheet.octopart.com/CRCW04020000Z0ED-Vishay-datasheet-10322335.pdf; ComponentLink25Description: http://datasheet.octopart.com/CRCW04020000Z0ED-Vishay-datasheet-10322335.pdf; ComponentLink26URL: http://datasheet.octopart.com/CRCW04020000Z0ED-Vishay-datasheet-12509762.pdf; ComponentLink26Description: http://datasheet.octopart.com/CRCW04020000Z0ED-Vishay-datasheet-12509762.pdf; ComponentLink27URL: http://datasheet.octopart.com/CRCW04020000Z0ED-Vishay-datasheet-12517896.pdf; ComponentLink27Description: http://datasheet.octopart.com/CRCW04020000Z0ED-Vishay-datasheet-12517896.pdf; ComponentLink28URL: http://datasheet.octopart.com/CRCW04020000Z0ED-Vishay-datasheet-12532161.pdf; ComponentLink28Description: http://datasheet.octopart.com/CRCW04020000Z0ED-Vishay-datasheet-12532161.pdf; ComponentLink29URL: http://datasheet.octopart.com/CRCW04020000Z0ED-Vishay-datasheet-12600034.pdf; ComponentLink29Description: http://datasheet.octopart.com/CRCW04020000Z0ED-Vishay-datasheet-12600034.pdf; ComponentLink30URL: http://datasheet.octopart.com/CRCW04020000Z0ED-Vishay-datasheet-13034211.pdf; ComponentLink30Description: http://datasheet.octopart.com/CRCW04020000Z0ED-Vishay-datasheet-13034211.pdf; ComponentLink31URL: http://datasheet.octopart.com/CRCW04020000Z0ED-Vishay-datasheet-13195083.pdf; ComponentLink31Description: http://datasheet.octopart.com/CRCW04020000Z0ED-Vishay-datasheet-13195083.pdf; ComponentLink32URL: http://datasheet.octopart.com/CRCW04020000Z0ED-Vishay-datasheet-13242068.pdf; ComponentLink32Description: http://datasheet.octopart.com/CRCW04020000Z0ED-Vishay-datasheet-13242068.pdf; ComponentLink33URL: http://datasheet.octopart.com/CRCW04020000Z0ED-Vishay-datasheet-14190200.pdf; ComponentLink33Description: http://datasheet.octopart.com/CRCW04020000Z0ED-Vishay-datasheet-14190200.pdf; ComponentLink34URL: http://datasheet.octopart.com/CRCW04020000Z0ED-Vishay-Dale-datasheet-38056517.pdf; ComponentLink34Description: http://datasheet.octopart.com/CRCW04020000Z0ED-Vishay-Dale-datasheet-38056517.pdf; ComponentLink35URL: http://datasheet.octopart.com/CRCW04020000Z0ED-Vishay-Dale-datasheet-47688880.pdf; ComponentLink35Description: http://datasheet.octopart.com/CRCW04020000Z0ED-Vishay-Dale-datasheet-47688880.pdf; ComponentLink36URL: http://datasheet.octopart.com/D-CRCW-e3-Standard-Thick-Film-Chip-Resistors-Vishay-datasheet-family-64.pdf; ComponentLink36Description: http://datasheet.octopart.com/D-CRCW-e3-Standard-Thick-Film-Chip-Resistors-Vishay-datasheet-family-64.pdf; Stock 1: 3532500; Pricing 1: 100=0.0089, 1000=0.0025, 10000=0.0013, 50000=0.00115, 250000=0.00105 (USD); Stock 2: 29923308; Pricing 2: 1=0.1, 10=0.014, 25=0.01, 50=0.0078, 100=0.0057, 250=0.00436, 500=0.00348, 1000=0.00257, 5000=0.00184 (USD); Case/Package: 0402; Case Code (Metric): 1005; Contact Plating: Matte,Tin; Min Operating Temperature: -55°C; Max Operating Temperature: 155°C; Packaging: Tape and Reel; Composition: Thick Film; Package Quantity: 1; Number of Terminations: 2; Termination: SMD/SMT; Features: Moisture Resistant; Military Standard: Not; Length: 1mm; Height: 0.016inch; Width: 0.02inch; Depth: 0.5mm; Radiation Hardening: No; Lead Free: Lead Free; REACH SVHC: Unknown; ComponentLink37URL: http://www.yageo.com/documents/recent/PYu-RC_Group_51_RoHS_L_9.pdf; ComponentLink37Description: http://www.yageo.com/documents/recent/PYu-RC_Group_51_RoHS_L_9.pdf; ComponentLink38URL: http://www.yageo.com/documents/recent/PYu-RC0402_51_RoHS_L_6.pdf; ComponentLink38Description: http://www.yageo.com/documents/recent/PYu-RC0402_51_RoHS_L_6.pdf; ComponentLink39URL: http://www.farnell.com/datasheets/1018594.pdf; ComponentLink39Description: http://www.farnell.com/datasheets/1018594.pdf; ComponentLink40URL: https://www.verical.com/server-webapp/html/getDatasheet?partID=326379; ComponentLink40Description: https://www.verical.com/server-webapp/html/getDatasheet?partID=326379; ComponentLink41URL: http://www.farnell.com/datasheets/2167052.pdf; ComponentLink41Description: http://www.farnell.com/datasheets/2167052.pdf; Mount: Surface Mount; Weight: 2.3E-05oz; Voltage Rating (DC): 50V; Stock 3: 70631880; Pricing 3: 1=0.1, 10=0.03, 25=0.0216, 50=0.0164, 100=0.0121, 250=0.00924, 500=0.0074, 1000=0.00545, 5000=0.00391 (USD); ComponentLink42URL: http://industrial.panasonic.com/www-data/pdf/AOA0000/AOA0000CE1.pdf; ComponentLink42Description: http://industrial.panasonic.com/www-data/pdf/AOA0000/AOA0000CE1.pdf; ComponentLink43URL: http://www.alliedelec.com/m/d/51cd0790071e1666bdb9d00c57fcf960.pdf; ComponentLink43Description: http://www.alliedelec.com/m/d/51cd0790071e1666bdb9d00c57fcf960.pdf; ComponentLink44URL: http://www.farnell.com/datasheets/2059623.pdf; ComponentLink44Description: http://www.farnell.com/datasheets/2059623.pdf; ComponentLink45URL: http://www.farnell.com/datasheets/1678796.pdf; ComponentLink45Description: http://www.farnell.com/datasheets/1678796.pdf; .SCHCHK: USED; Supplier 1: Digi-Key; Supplier Part Number 1: 311-0.0JRDKR-ND
footprint JMP-0402
pins: 1, 2

## R-0R-0402 3 Pad
designator R?, comment 0R  Case Code (Imperial): 0402